# Altium footprint library Connector.PcbLib: 37 footprints (part 1 of 3)
Each footprint in its own frame and in the unit in brackets; x right, y up, seen from the top. Pads: shape width x height; smd on the part's side, far side on the other; paste and mask are expansions set on the pad; w line width, h text height; cw(c..) or ccw(c..) is an arc to the next point about the centre after c.
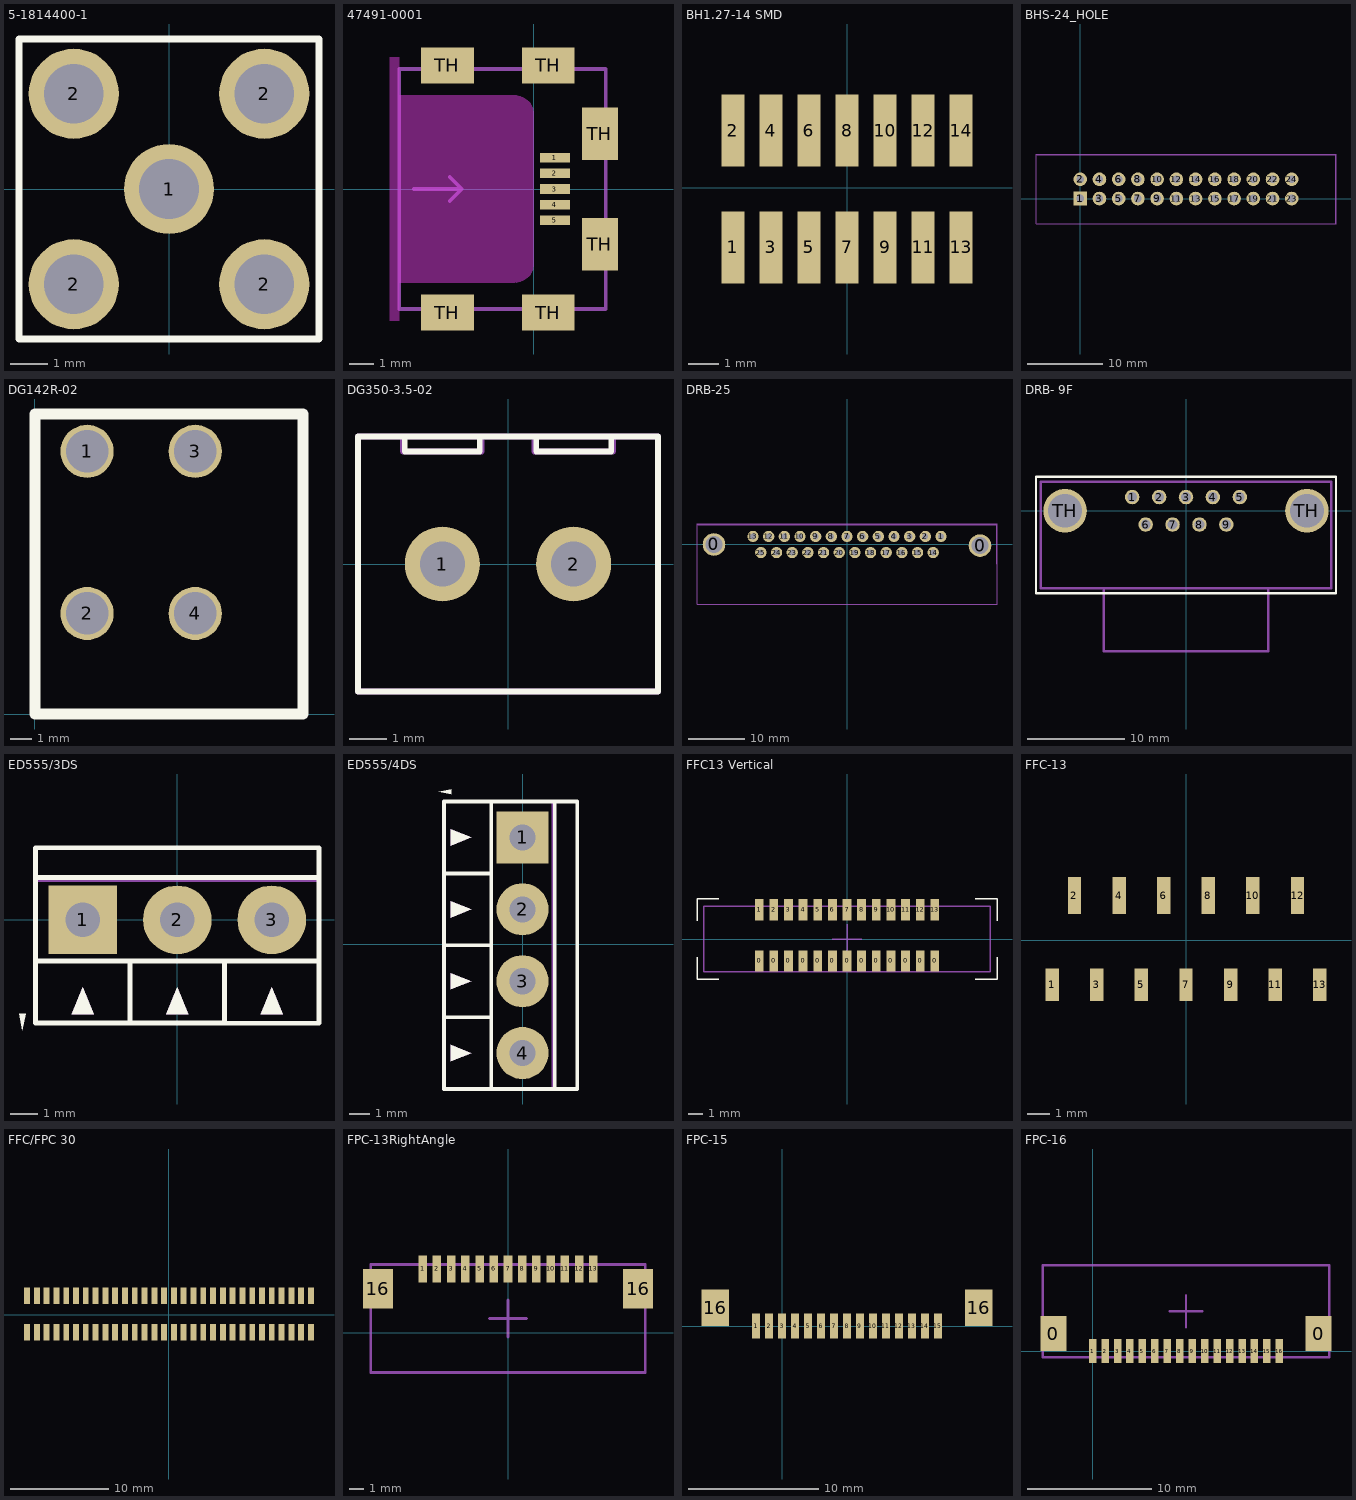
[diagram p0: the footprints below, top view; thin cyan lines are the x and y axes]

## 5-1814400-1 [mm] "TE, SMA Connector Jack, Female Socket 50 Ohm Through Hole, Right Angle Solder"
height 10.43
pads (5):
  round 2.4 hole 1.6: 1(0,0) 2(-2.54,-2.54) 2(-2.54,2.54) 2(2.54,-2.54) 2(2.54,2.54)
Top Overlay:
  lines w0.2: -4,-4 -4,4 4,4 4,-4 -4,-4
3D body "c-5-1814400-1-d-3d.stp": height 2.6, standoff -10.93, extent -3.163,-11.05 3.164,3.15

## 47491-0001 [mm]
pads (11):
  rect 1.25x0.4 smd: 1(0.875,1.3) 2(0.875,0.65) 3(0.875,0) 4(0.875,-0.65) 5(0.875,-1.3)
  rect 2.2x1.5 smd: TH(-3.6,-5.15) TH(-3.6,5.15) TH(0.6,-5.15) TH(0.6,5.15)
  rect 1.5x2.2 smd: TH(2.75,-2.3) TH(2.75,2.3)
Keep-Out Layer:
  board cut-out: -6,-5.5 -6,5.5 -5.6,5.5 -5.6,3.9 -0.8,3.9 -0.721,3.9 -0.567,3.869 -0.421,3.809 -0.29,3.721 -0.179,3.61 -0.091,3.479 -0.031,3.333 0,3.179 0,3.1 0,-3.1 0,-3.179 -0.031,-3.333 -0.091,-3.479 -0.179,-3.61 -0.29,-3.721 -0.421,-3.809 -0.567,-3.869 -0.721,-3.9 -0.8,-3.9 -5.6,-3.9 -5.6,-5.5
Mechanical 29:
  lines w0.15: -5,0 -3,0 ; -3.5,-0.5 -3,0 ; -3.5,0.5 -3,0 ; -5.6,-5 -5.6,5 3,5 3,-5 -5.6,-5
  text ".Designator" at -4.5,2.7 h1
3D body "474910001.stp": height 1.47, standoff -1.47, extent -5.905,-5.5 3.225,5.5

## BH1.27-14 SMD [mm]
pads (14):
  rect 0.76x2.4 smd: 1(-3.81,-2) 2(-3.81,1.9) 3(-2.54,-2) 4(-2.54,1.9) 5(-1.27,-2) 6(-1.27,1.9) 7(0,-2) 8(0,1.9) 9(1.27,-2) 10(1.27,1.9) 11(2.54,-2) 12(2.54,1.9) 13(3.81,-2) 14(3.81,1.9)
3D body: height 0.6, standoff 0.5, extent -7.6,-2.55 7.6,2.55
3D body: height 5.4, standoff 0.6, extent -7.6,-2.55 7.6,2.55
3D body: height 5.4, standoff 0.6, extent -7.6,-2.55 7.6,2.55
3D body: height 0.4, standoff 0.1, extent 3.51,0.575 4.11,3.225
3D body: height 4.6, standoff 0.3, extent 3.51,0.563 4.11,1.188
3D body: height 0.4, standoff 0.1, extent 3.51,-3.325 4.11,-0.675
3D body: height 4.6, standoff 0.3, extent 3.51,-1.288 4.11,-0.663
3D body: height 0.4, standoff 0.1, extent 2.24,0.575 2.84,3.225
3D body: height 4.6, standoff 0.3, extent 2.24,0.563 2.84,1.188
3D body: height 0.4, standoff 0.1, extent 2.24,-3.325 2.84,-0.675
3D body: height 4.6, standoff 0.3, extent 2.24,-1.288 2.84,-0.663
3D body: height 0.4, standoff 0.1, extent 0.97,0.575 1.57,3.225
3D body: height 4.6, standoff 0.3, extent 0.97,0.563 1.57,1.188
3D body: height 0.4, standoff 0.1, extent 0.97,-3.325 1.57,-0.675
3D body: height 4.6, standoff 0.3, extent 0.97,-1.288 1.57,-0.663
3D body: height 0.4, standoff 0.1, extent -0.3,0.575 0.3,3.225
3D body: height 4.6, standoff 0.3, extent -0.3,0.563 0.3,1.188
3D body: height 0.4, standoff 0.1, extent -0.3,-3.325 0.3,-0.675
3D body: height 4.6, standoff 0.3, extent -0.3,-1.288 0.3,-0.663
3D body: height 0.4, standoff 0.1, extent -1.57,0.575 -0.97,3.225
3D body: height 4.6, standoff 0.3, extent -1.57,0.563 -0.97,1.188
3D body: height 0.4, standoff 0.1, extent -1.57,-3.325 -0.97,-0.675
3D body: height 4.6, standoff 0.3, extent -1.57,-1.288 -0.97,-0.663
3D body: height 0.4, standoff 0.1, extent -2.84,0.575 -2.24,3.225
3D body: height 4.6, standoff 0.3, extent -2.84,0.563 -2.24,1.188
3D body: height 0.4, standoff 0.1, extent -2.84,-3.325 -2.24,-0.675
3D body: height 4.6, standoff 0.3, extent -2.84,-1.288 -2.24,-0.663
3D body: height 4.6, standoff 0.3, extent -4.11,-1.288 -3.51,-0.663
3D body: height 0.4, standoff 0.1, extent -4.11,-3.325 -3.51,-0.675
3D body: height 4.6, standoff 0.3, extent -4.11,0.563 -3.51,1.188
3D body: height 0.4, standoff 0.1, extent -4.11,0.575 -3.51,3.225

## BHS-24_HOLE [mm]
pads (24):
  rect 1.8x1.8 hole 1: 1(0,0)
  round 1.8 hole 1: 2(0,2.54) 3(2.54,0) 4(2.54,2.54) 5(5.08,0) 6(5.08,2.54) 7(7.62,0) 8(7.62,2.54) 9(10.16,0) 10(10.16,2.54) 11(12.7,0) 12(12.7,2.54) 13(15.24,0) 14(15.24,2.54) 15(17.78,0) 16(17.78,2.54) 17(20.32,0) 18(20.32,2.54) 19(22.86,0) 20(22.86,2.54) 21(25.4,0) 22(25.4,2.54) 23(27.94,0) 24(27.94,2.54)
Mechanical 29:
  circle w0.15: c0,0 r0.554
  lines w0.15: -5.842,-3.302 33.782,-3.302 33.782,5.842 -5.842,5.842 -5.842,-3.302 ; -5.8,-3.325 -5.8,5.8 33.725,5.8 33.725,-3.325 -5.8,-3.325
  text ".Designator" at 10.5,0.7 h1
3D body "IDC-24MS.STEP": height 9.1, standoff -3, extent -4.99,-3.275 33.09,6.325

## DG142R-02 [mm]
height 14
pads (4):
  round 2.5 hole 2: 1(2.45,12.345) 2(2.45,4.725) 3(7.53,12.345) 4(7.53,4.725)
Top Overlay:
  lines w0.5: 0,0 12.6,0 12.6,14.1 0,14.1 0,0
3D body "DG142R-2-5.08.stp": height 15.4, standoff -1.5, extent 0,0 12.6,14.1

## DG350-3.5-02 [mm]
height 10
pads (2):
  round 2 hole 1.2: 1(-1.75,0) 2(1.75,0)
Top Overlay:
  lines w0.15: -2.75,3.4 -2.75,3 -0.75,3 -0.75,3.4 ; 0.75,3.4 0.75,3 2.75,3 2.75,3.4 ; -4,-3.4 4,-3.4 4,3.4 -4,3.4 -4,-3.4
Mechanical 29:
  lines w0.15: -2.8,3.4 -2.8,3 -0.7,3 -0.7,3.4 ; 0.7,3.4 0.7,3 2.8,3 2.8,3.4 ; -4,-3.4 -4,3.4 4,3.4 4,-3.4 -4,-3.4
  text ".Designator" at -3,-0.3 h1
3D body "DG350-3,5-02P.step": height 8.4, standoff -3.4, extent -4,-3.4 4,3.4

## DRB-25 [mm]
height 12.5
pads (27):
  round 4 hole 3: 0(-23.52,0) 0(23.52,-0.2)
  round 2 hole 1: 1(16.62,1.42) 2(13.85,1.42) 3(11.08,1.42) 4(8.31,1.42) 5(5.54,1.42) 6(2.77,1.42) 7(0,1.42) 8(-2.77,1.42) 9(-5.54,1.42) 10(-8.31,1.42) 11(-11.08,1.42) 12(-13.85,1.42) 13(-16.62,1.42) 14(15.24,-1.42) 15(12.47,-1.42) 16(9.7,-1.42) 17(6.93,-1.42) 18(4.16,-1.42) 19(1.39,-1.42) 20(-1.38,-1.42) 21(-4.15,-1.42) 22(-6.92,-1.42) 23(-9.69,-1.42) 24(-12.46,-1.42) 25(-15.23,-1.42)
Mechanical 29:
  lines w0.15: -26.5,-3.5 -26.5,3.5 26.5,3.5 26.5,-3.5 ; -26.52,-10.6 -26.52,3.7 26.52,3.7 26.52,-10.6 -26.52,-10.6
  text ".Designator" at -3.5,-3.8 h1
3D body "DB-25S-1A5N-A191-A197.STEP": height 13.77, standoff -3.48, extent -26.55,-17.13 26.55,3.4

## DRB- 9F [mm]
height 12.5
pads (11):
  round 1.5 hole 1: 1(-5.56,1.42) 2(-2.78,1.42) 3(0,1.42) 4(2.78,1.42) 5(5.56,1.42) 6(-4.17,-1.42) 7(-1.39,-1.42) 8(1.39,-1.42) 9(4.17,-1.42)
  round 4.5 hole 3.5: TH(-12.5,0) TH(12.5,0)
Top Overlay:
  lines w0.254: -15.5,-8.5 15.5,-8.5 15.5,3.5 -15.5,3.5 -15.5,-8.5
Mechanical 29:
  lines w0.254: -8.5,-8 -8.5,-14.5 8.5,-14.5 8.5,-8 ; -15,-8 15,-8 15,3 -15,3 -15,-8
  text ".Designator" at -6,-6 h1.52
3D body "DB-9F.step": height 12.75, standoff -3.65, extent -15.25,-13.5 15.25,3.2

## ED555/3DS [mm]
pads (3):
  rect 2.54x2.54 hole 1.27: 1(-3.5,0)
  round 2.54 hole 1.27: 2(0,0) 3(3.5,0)
Top Overlay:
  region: 3.9,-3.5 3.1,-3.5 3.5,-2.5
  region: 0.4,-3.5 -0.4,-3.5 0,-2.5
  region: -5.735,-4.089 -5.608,-3.48 -5.862,-3.48
  region: -3.1,-3.5 -3.9,-3.5 -3.5,-2.5
  lines w0.178: -5.252,1.572 -1.752,1.572 1.748,1.572 5.248,1.572 ; -1.75,-3.815 -1.75,-1.528 ; 1.75,-3.815 1.75,-1.528 ; 1.75,-3.81 -5.25,-3.81 -5.25,2.667 1.75,2.667 ; -5.252,-1.528 -5.252,-3.828 -1.752,-3.828 1.748,-3.828 5.248,-3.828 5.248,-1.528 ; -5.252,-1.528 -1.752,-1.528 1.748,-1.528 5.248,-1.528 ; -5.252,-1.528 -5.252,1.472 -5.252,2.672 -1.752,2.672 1.748,2.672 5.248,2.672 5.248,1.472 5.248,-1.528
Mechanical 5:
  region: 3.9,-3.5 3.1,-3.5 3.5,-2.5
  region: 0.4,-3.5 -0.4,-3.5 0,-2.5
  region: -3.1,-3.5 -3.9,-3.5 -3.5,-2.5
  lines w0.127: -1.75,-3.815 -1.75,-1.528 ; 1.75,-3.815 1.75,-1.528 ; 1.75,-3.81 -5.25,-3.81 -5.25,2.667 1.75,2.667 ; -5.252,-1.528 -1.752,-1.528 1.748,-1.528 5.248,-1.528 ; -5.252,-1.528 -5.252,-3.828 -1.752,-3.828 1.748,-3.828 5.248,-3.828 5.248,-1.528 ; -5.252,-1.528 -5.252,1.472 ; -5.252,1.472 -1.752,1.472 1.748,1.472 5.248,1.472 ; -5.252,1.472 -5.252,2.672 -1.752,2.672 1.748,2.672 5.248,2.672 5.248,1.472 ; 5.248,-1.528 5.248,1.472
3D body "On-Shore_ED555_3DS.stp": height 8.2, standoff -3.5, extent -5.252,-3.828 5.248,2.672

## ED555/4DS [mil]
height 30
pads (4):
  rect 100x100 hole 50: 1(0,205)
  round 100 hole 50: 2(0,67.2) 3(0,-70.59) 4(0,-208.39)
Top Overlay:
  region: -137.8,-224.13 -137.8,-192.64 -98.43,-208.39
  region: -137.8,-86.34 -137.8,-54.84 -98.43,-70.59
  region: -137.8,51.46 -137.8,82.95 -98.43,67.2
  region: -161,293 -137,288 -137,298
  region: -137.8,189.25 -137.8,220.75 -98.43,205
  lines w7: -150.72,-277.21 -150.72,-139.42 ; -150.2,-277.28 -60.17,-277.28 57.94,-277.28 105.19,-277.28 ; -150.2,-1.69 -60.17,-1.69 ; -150.2,136.1 -60.17,136.1 ; -150,-1.69 -150,273.9 105,273.9 105,-1.69 ; -60.17,-277.21 -60.17,-139.42 ; 61.88,-277.21 61.88,-139.42 61.88,-1.62 61.88,136.17 61.88,273.97 ; 105.19,-277.21 105.19,-139.42 105.19,-1.62 105.19,136.17 105.19,273.97 57.94,273.97 -60.17,273.97 ; -150.72,-139.42 -150.72,-1.62 -150.72,136.17 -150.72,273.97 -60.17,273.97 ; -150.72,-139.42 -60.17,-139.42 ; -150.72,-139.42 -60.17,-139.42 ; -60.17,-139.42 -60.17,-1.62 -60.17,136.17 -60.17,273.97
Mechanical 5:
  region: -137.8,-224.13 -137.8,-192.64 -98.43,-208.39
  region: -137.8,-86.34 -137.8,-54.84 -98.43,-70.59
  region: -137.8,51.46 -137.8,82.95 -98.43,67.2
  region: -137.8,189.25 -137.8,220.75 -98.43,205
  lines w5: -150.72,-277.21 -150.72,-139.42 ; -150.2,-277.28 -60.17,-277.28 57.94,-277.28 105.19,-277.28 ; -150.2,-1.69 -60.17,-1.69 ; -150.2,136.1 -60.17,136.1 ; -150,-277.21 -150,-139.49 ; -150,-1.69 -150,273.9 105,273.9 105,-1.69 ; -60.17,-277.21 -60.17,-139.42 ; 57.94,-277.21 57.94,-139.42 57.94,-1.62 57.94,136.17 57.94,273.97 ; 105,-277.21 105,-139.49 ; 105.19,-277.21 105.19,-139.42 105.19,-1.62 105.19,136.17 105.19,273.97 57.94,273.97 ; -150.72,-139.42 -150.72,-1.62 -150.72,136.17 -150.72,273.97 -60.17,273.97 ; -150.72,-139.42 -60.17,-139.42 ; -60.17,-139.42 -60.17,-1.62 -60.17,136.17 -60.17,273.97 ; -60.17,273.97 57.94,273.97
3D body "On-Shore_ED555_4DS.stp": height 322.83, standoff -137.8, extent -149.62,-277.47 106.28,273.71

## FFC13 Vertical [mm]
pads (26):
  rect 0.6x1.45 smd: 0(-6,-1.5) 0(-5,-1.5) 0(-4,-1.5) 0(-3,-1.5) 0(-2,-1.5) 0(-1,-1.5) 0(0,-1.5) 0(1,-1.5) 0(2,-1.5) 0(3,-1.5) 0(4,-1.5) 0(5,-1.5) 0(6,-1.5) 1(-6,2) 2(-5,2) 3(-4,2) 4(-3,2) 5(-2,2) 6(-1,2) 7(0,2) 8(1,2) 9(2,2) 10(3,2) 11(4,2) 12(5,2) 13(6,2)
Top Overlay:
  lines w0.1: -10.25,-1.25 -10.25,-2.75 -8.75,-2.75 ; -10.25,1.25 -10.25,2.75 -8.75,2.75 ; 8.75,-2.75 10.25,-2.75 10.25,-1.25 ; 8.75,2.75 10.25,2.75 10.25,1.25
Mechanical 32:
  lines w0.1: -1,0 1,0 ; 0,-1 0,1 ; -9.8,-2.25 -9.8,2.25 9.8,2.25 9.8,-2.25 -9.8,-2.25
3D body "526101372.stp": height 5.7, standoff -0.05, extent -9.8,-2.25 9.8,2.25

## FFC-13 [mm] "1.00mm Pitch Easy-On FFC/FPC Connector, Surface Mount, Vertical, Non-ZIF, Tin (Sn) Plating, 13 Circuits"
pads (13):
  rect 0.6x1.45 smd: 1(-6,-2) 3(-4,-2) 5(-2,-2) 7(0,-2) 9(2,-2) 11(4,-2) 13(6,-2)
  rect 0.6x1.65 smd: 2(-5,2) 4(-3,2) 6(-1,2) 8(1,2) 10(3,2) 12(5,2)
3D body "528081370.stp": height 5.1, standoff 0, extent -8,-2.25 8,2.25

## FFC/FPC 30 [mm]
pads (60):
  rect 0.6x1.65 smd: 1(-14.45,-1.8) 1(-14.45,1.925) 2(-13.45,-1.8) 2(-13.45,1.925) 3(-12.45,-1.8) 3(-12.45,1.925) 4(-11.45,-1.8) 4(-11.45,1.925) 5(-10.45,-1.8) 5(-10.45,1.925) 6(-9.45,-1.8) 6(-9.45,1.925) 7(-8.45,-1.8) 7(-8.45,1.925) 8(-7.45,-1.8) 8(-7.45,1.925) 9(-6.45,-1.8) 9(-6.45,1.925) 10(-5.45,-1.8) 10(-5.45,1.925) 11(-4.45,-1.8) 11(-4.45,1.925) 12(-3.45,-1.8) 12(-3.45,1.925) 13(-2.45,-1.8) 13(-2.45,1.925) 14(-1.45,-1.8) 14(-1.45,1.925) 15(-0.45,-1.8) 15(-0.45,1.925) 16(0.55,-1.8) 16(0.55,1.925) 17(1.55,-1.8) 17(1.55,1.925) 18(2.55,-1.8) 18(2.55,1.925) 19(3.55,-1.8) 19(3.55,1.925) 20(4.55,-1.8) 20(4.55,1.925) 21(5.55,-1.8) 21(5.55,1.925) 22(6.55,-1.8) 22(6.55,1.925) 23(7.55,-1.8) 23(7.55,1.925) 24(8.55,-1.8) 24(8.55,1.925) 25(9.55,-1.8) 25(9.55,1.925) 26(10.55,-1.8) 26(10.55,1.925) 27(11.55,-1.8) 27(11.55,1.925) 28(12.55,-1.8) 28(12.55,1.925) 29(13.55,-1.8) 29(13.55,1.925) 30(14.55,-1.8) 30(14.55,1.925)
3D body "526103072.stp": height 5.7, standoff -0.05, extent -18.25,-2.2 18.35,2.3

## FPC-13RightAngle [mm]
pads (15):
  rect 0.6x1.9 smd: 1(-6,4.5) 2(-5,4.5) 3(-4,4.5) 4(-3,4.5) 5(-2,4.5) 6(-1,4.5) 7(0,4.5) 8(1,4.5) 9(2,4.5) 10(3,4.5) 11(4,4.5) 12(5,4.5) 13(6,4.5)
  rect 2.1x2.8 smd: 16(-9.15,3.1) 16(9.15,3.1)
Mechanical 32:
  lines w0.2: -1.3,1 0,1 ; 0,-0.3 0,1 ; 0,2.3 0,1 ; 1.3,1 0,1 ; -9.65,-2.8 -9.65,4.8 9.65,4.8 9.65,-2.8 -9.65,-2.8
3D body "522071360.stp": height 2.75, standoff 0.05, extent -9.65,-2.8 9.65,4.8

## FPC-15 [mm]
pads (17):
  rect 0.6x1.9 smd: 1(-2,0) 2(-1,0) 3(0,0) 4(1,0) 5(2,0) 6(3,0) 7(4,0) 8(5,0) 9(6,0) 10(7,0) 11(8,0) 12(9,0) 13(10,0) 14(11,0) 15(12,0)
  rect 2.1x2.8 smd: 16(-5.15,1.4) 16(15.15,1.4)
3D body "522711569.stp": height 3, standoff 0, extent -6,-0.5 16,6.9

## FPC-16 [mm]
pads (18):
  rect 2.1x2.8 smd: 0(-3.15,1.4) 0(18.15,1.4)
  rect 0.6x1.9 smd: 1(0,0) 2(1,0) 3(2,0) 4(3,0) 5(4,0) 6(5,0) 7(6,0) 8(7,0) 9(8,0) 10(9,0) 11(10,0) 12(11,0) 13(12,0) 14(13,0) 15(14,0) 16(15,0)
Mechanical 32:
  lines w0.2: 5.1,6.9 -4,6.9 ; 6.2,3.2 7.5,3.2 ; 7.5,1.9 7.5,3.2 ; 7.5,4.5 7.5,3.2 ; 8.8,3.2 7.5,3.2 ; -4,6.9 19,6.9 19,-0.5 -4,-0.5 -4,6.9
3D body "16.stp": height 3, standoff 0, extent -4,-0.5 19,6.9